# Altium footprint library ref-packages.PCBLIB: 1544 footprints (part 41 of 103) (continued)
## PLCC52 [mil] (continued)
  lines w6: -376.38,-319.33 -376.38,-356.69 -356.69,-376.38 -319.33,-376.38 ; -376.38,-280.67 -376.38,-269.33 ; -376.38,-230.67 -376.38,-219.33 ; -376.38,-180.67 -376.38,-169.33 ; -376.38,-130.67 -376.38,-119.33 ; -376.38,-80.67 -376.38,-69.33 ; -376.38,-30.67 -376.38,-19.33 ; -376.38,19.33 -376.38,30.67 ; -376.38,69.33 -376.38,80.67 ; -376.38,119.33 -376.38,130.67 ; -376.38,169.33 -376.38,180.67 ; -376.38,219.33 -376.38,230.67 ; -376.38,269.33 -376.38,280.67 ; -376.38,319.33 -376.38,327.17 -319.33,372.4 ; -280.67,-376.38 -269.33,-376.38 ; -280.67,376.38 -269.33,376.38 ; -230.67,-376.38 -219.33,-376.38 ; -230.67,376.38 -219.33,376.38 ; -180.67,-376.38 -169.33,-376.38 ; -180.67,376.38 -169.33,376.38 ; -130.67,-376.38 -119.33,-376.38 ; -130.67,376.38 -119.33,376.38 ; -80.67,-376.38 -69.33,-376.38 ; -80.67,376.38 -69.33,376.38 ; -30.67,-376.38 -19.33,-376.38 ; -30.67,376.38 -19.33,376.38 ; 19.33,-376.38 30.67,-376.38 ; 19.33,376.38 30.67,376.38 ; 69.33,-376.38 80.67,-376.38 ; 69.33,376.38 80.67,376.38 ; 119.33,-376.38 130.67,-376.38 ; 119.33,376.38 130.67,376.38 ; 169.33,-376.38 180.67,-376.38 ; 169.33,376.38 180.67,376.38 ; 219.33,-376.38 230.67,-376.38 ; 219.33,376.38 230.67,376.38 ; 269.33,-376.38 280.67,-376.38 ; 269.33,376.38 280.67,376.38 ; 319.33,-376.38 356.69,-376.38 376.38,-356.69 ; 319.33,376.38 356.69,376.38 376.38,356.69 ; 356.69,-346.85 376.38,-356.69 ; 356.69,327.17 376.38,356.69 ; 376.38,-319.33 376.38,-356.69 ; 376.38,-280.67 376.38,-269.33 ; 376.38,-230.67 376.38,-219.33 ; 376.38,-180.67 376.38,-169.33 ; 376.38,-130.67 376.38,-119.33 ; 376.38,-80.67 376.38,-69.33 ; 376.38,-30.67 376.38,-19.33 ; 376.38,19.33 376.38,30.67 ; 376.38,69.33 376.38,80.67 ; 376.38,119.33 376.38,130.67 ; 376.38,169.33 376.38,180.67 ; 376.38,219.33 376.38,230.67 ; 376.38,269.33 376.38,280.67 ; 376.38,319.33 376.38,356.69
Mechanical 16:
  circle w2: c0,284.65 r19.69
  rectangle: 376.38,85.04 394.88,114.96
  rectangle: 376.38,35.04 394.88,64.96
  rectangle: 376.38,-14.96 394.88,14.96
  rectangle: 376.38,-64.96 394.88,-35.04
  rectangle: 376.38,-114.96 394.88,-85.04
  rectangle: 376.38,-164.96 394.88,-135.04
  rectangle: 376.38,-214.96 394.88,-185.04
  rectangle: 135.04,-394.88 164.96,-376.38
  rectangle: 85.04,-394.88 114.96,-376.38
  rectangle: 35.04,-394.88 64.96,-376.38
  rectangle: -14.96,-394.88 14.96,-376.38
  rectangle: -64.96,-394.88 -35.04,-376.38
  rectangle: -114.96,-394.88 -85.04,-376.38
  rectangle: -314.96,-394.88 -285.04,-376.38
  rectangle: -394.88,185.04 -376.38,214.96
  rectangle: -394.88,135.04 -376.38,164.96
  rectangle: -394.88,85.04 -376.38,114.96
  rectangle: -394.88,35.04 -376.38,64.96
  rectangle: -394.88,-14.96 -376.38,14.96
  rectangle: -394.88,-64.96 -376.38,-35.04
  rectangle: -394.88,-114.96 -376.38,-85.04
  rectangle: 135.04,376.38 164.96,394.88
  rectangle: 85.04,376.38 114.96,394.88
  rectangle: 35.04,376.38 64.96,394.88
  rectangle: -14.96,376.38 14.96,394.88
  rectangle: -64.96,376.38 -35.04,394.88
  rectangle: -114.96,376.38 -85.04,394.88
  rectangle: -314.96,376.38 -285.04,394.88
  rectangle: 376.38,135.04 394.88,164.96
  rectangle: 376.38,185.04 394.88,214.96
  rectangle: -394.88,-164.96 -376.38,-135.04
  rectangle: -394.88,-214.96 -376.38,-185.04
  rectangle: 185.04,376.38 214.96,394.88
  rectangle: 285.04,376.38 314.96,394.88
  rectangle: -164.96,376.38 -135.04,394.88
  rectangle: -214.96,376.38 -185.04,394.88
  rectangle: -394.88,-314.96 -376.38,-285.04
  rectangle: -214.96,-394.88 -185.04,-376.38
  rectangle: -164.96,-394.88 -135.04,-376.38
  rectangle: 185.04,-394.88 214.96,-376.38
  rectangle: 285.04,-394.88 314.96,-376.38
  rectangle: 376.38,-314.96 394.88,-285.04
  rectangle: 376.38,285.04 394.88,314.96
  rectangle: -394.88,285.04 -376.38,314.96
  rectangle: -264.96,376.38 -235.04,394.88
  rectangle: -394.88,235.04 -376.38,264.96
  rectangle: -394.88,-264.96 -376.38,-235.04
  rectangle: -264.96,-394.88 -235.04,-376.38
  rectangle: 235.04,-394.88 264.96,-376.38
  rectangle: 376.38,-264.96 394.88,-235.04
  rectangle: 376.38,235.04 394.88,264.96
  rectangle: 235.04,376.38 264.96,394.88
  lines w2: -376.38,-356.69 -356.69,-346.85 ; -376.38,327.17 -356.69,327.17 ; -356.69,-376.38 -346.85,-356.69 ; -314.96,376.38 -356.69,327.17 ; 356.69,-376.38 346.85,-356.69 ; 376.38,-356.69 356.69,-346.85 ; 376.38,356.69 356.69,327.17 ; -356.69,-346.85 -346.85,-356.69 ; -356.69,-346.85 -356.69,327.17 ; -356.69,327.17 356.69,327.17 ; -346.85,-356.69 346.85,-356.69 ; 346.85,-356.69 356.69,-346.85 ; 356.69,-346.85 356.69,327.17
  lines w6: -376.38,-356.69 -356.69,-376.38 356.69,-376.38 376.38,-356.69 376.38,356.69 356.69,376.38 -314.96,376.38 -376.38,327.17 -376.38,-356.69

## PLCC52-S [mil]
pads (52):
  round 48 hole 32: 1(0,400)
  oct 48x48 hole 32: 2(0,300) 3(-100,400) 4(-100,300) 5(-200,400) 6(-200,300) 7(-300,400) 8(-400,300) 9(-300,300) 10(-400,200) 11(-300,200) 12(-400,100) 13(-300,100) 14(-400,0) 15(-300,0) 16(-400,-100) 17(-300,-100) 18(-400,-200) 19(-300,-200) 20(-400,-300) 21(-300,-400) 22(-300,-300) 23(-200,-400) 24(-200,-300) 25(-100,-400) 26(-100,-300) 27(0,-400) 28(0,-300) 29(100,-400) 30(100,-300) 31(200,-400) 32(200,-300) 33(300,-400) 34(400,-300) 35(300,-300) 36(400,-200) 37(300,-200) 38(400,-100) 39(300,-100) 40(400,0) 41(300,0) 42(400,100) 43(300,100) 44(300,200) 45(400,200) 46(400,300) 47(300,400) 48(300,300) 49(200,400) 50(200,300) 51(100,400) 52(100,300)
Top Overlay:
  drawing of 199 lines, arcs and shapes, not listed
  text "52" at 375,-475 h77.5
Mechanical 16:
  drawing of 160 lines, arcs and shapes, not listed

## PLCC52S [mil]
pads (52):
  rect 23.62x86.61 smd: 1(0,370.08) 2(-50,370.08) 3(-100,370.08) 4(-150,370.08) 5(-200,370.08) 6(-250,370.08) 7(-300,370.08) 21(-300,-370.08) 22(-250,-370.08) 23(-200,-370.08) 24(-150,-370.08) 25(-100,-370.08) 26(-50,-370.08) 27(0,-370.08) 28(50,-370.08) 29(100,-370.08) 30(150,-370.08) 31(200,-370.08) 32(250,-370.08) 33(300,-370.08) 47(300,370.08) 48(250,370.08) 49(200,370.08) 50(150,370.08) 51(100,370.08) 52(50,370.08)
  rect 86.61x23.62 smd: 8(-370.08,300) 9(-370.08,250) 10(-370.08,200) 11(-370.08,150) 12(-370.08,100) 13(-370.08,50) 14(-370.08,0) 15(-370.08,-50) 16(-370.08,-100) 17(-370.08,-150) 18(-370.08,-200) 19(-370.08,-250) 20(-370.08,-300) 34(370.08,-300) 35(370.08,-250) 36(370.08,-200) 37(370.08,-150) 38(370.08,-100) 39(370.08,-50) 40(370.08,0) 41(370.08,50) 42(370.08,100) 43(370.08,150) 44(370.08,200) 45(370.08,250) 46(370.08,300)
Mechanical 16:
  circle w24: c0,350.39 r11.81
  rectangle: -10.24,395.67 10.24,413.39
  rectangle: -60.24,395.67 -39.76,413.39
  rectangle: -110.24,395.67 -89.76,413.39
  rectangle: -160.24,395.67 -139.76,413.39
  rectangle: -210.24,395.67 -189.76,413.39
  rectangle: -260.24,395.67 -239.76,413.39
  rectangle: -310.24,395.67 -289.76,413.39
  rectangle: -413.39,289.76 -395.67,310.24
  rectangle: -413.39,239.76 -395.67,260.24
  rectangle: -413.39,189.76 -395.67,210.24
  rectangle: -413.39,139.76 -395.67,160.24
  rectangle: -413.39,89.76 -395.67,110.24
  rectangle: -413.39,39.76 -395.67,60.24
  rectangle: -413.39,-10.24 -395.67,10.24
  rectangle: -413.39,-60.24 -395.67,-39.76
  rectangle: -413.39,-110.24 -395.67,-89.76
  rectangle: -413.39,-160.24 -395.67,-139.76
  rectangle: -413.39,-210.24 -395.67,-189.76
  rectangle: -413.39,-260.24 -395.67,-239.76
  rectangle: -413.39,-310.24 -395.67,-289.76
  rectangle: -310.24,-413.39 -289.76,-395.67
  rectangle: -260.24,-413.39 -239.76,-395.67
  rectangle: -210.24,-413.39 -189.76,-395.67
  rectangle: -160.24,-413.39 -139.76,-395.67
  rectangle: -110.24,-413.39 -89.76,-395.67
  rectangle: -60.24,-413.39 -39.76,-395.67
  rectangle: -10.24,-413.39 10.24,-395.67
  rectangle: 39.76,-413.39 60.24,-395.67
  rectangle: 89.76,-413.39 110.24,-395.67
  rectangle: 139.76,-413.39 160.24,-395.67
  rectangle: 189.76,-413.39 210.24,-395.67
  rectangle: 239.76,-413.39 260.24,-395.67
  rectangle: 289.76,-413.39 310.24,-395.67
  rectangle: 395.67,-310.24 413.39,-289.76
  rectangle: 395.67,-260.24 413.39,-239.76
  rectangle: 395.67,-210.24 413.39,-189.76
  rectangle: 395.67,-160.24 413.39,-139.76
  rectangle: 395.67,-110.24 413.39,-89.76
  rectangle: 395.67,-60.24 413.39,-39.76
  rectangle: 395.67,-10.24 413.39,10.24
  rectangle: 395.67,39.76 413.39,60.24
  rectangle: 395.67,89.76 413.39,110.24
  rectangle: 395.67,139.76 413.39,160.24
  rectangle: 395.67,189.76 413.39,210.24
  rectangle: 395.67,239.76 413.39,260.24
  rectangle: 395.67,289.76 413.39,310.24
  rectangle: 289.76,395.67 310.24,413.39
  rectangle: 239.76,395.67 260.24,413.39
  rectangle: 189.76,395.67 210.24,413.39
  rectangle: 139.76,395.67 160.24,413.39
  rectangle: 89.76,395.67 110.24,413.39
  rectangle: 39.76,395.67 60.24,413.39
  lines w8: -393.7,-393.7 -393.7,305.71 -305.71,393.7 393.7,393.7 393.7,-393.7 -393.7,-393.7
Mechanical 27:
  lines w7.87: -429.25,-429.25 429.25,-429.25 429.25,429.25 -429.25,429.25 -429.25,-429.25

## PLCC68 [mil]
pads (68):
  rect 29.92x70.87 smd: 1(0,459.45) 2(-50,459.45) 3(-100,459.45) 4(-150,459.45) 5(-200,459.45) 6(-250,459.45) 7(-300,459.45) 8(-350,459.45) 9(-400,459.45) 27(-400,-459.45) 28(-350,-459.45) 29(-300,-459.45) 30(-250,-459.45) 31(-200,-459.45) 32(-150,-459.45) 33(-100,-459.45) 34(-50,-459.45) 35(0,-459.45) 36(50,-459.45) 37(100,-459.45) 38(150,-459.45) 39(200,-459.45) 40(250,-459.45) 41(300,-459.45) 42(350,-459.45) 43(400,-459.45) 61(400,459.45) 62(350,459.45) 63(300,459.45) 64(250,459.45) 65(200,459.45) 66(150,459.45) 67(100,459.45) 68(50,459.45)
  rect 70.87x29.92 smd: 10(-459.45,400) 11(-459.45,350) 12(-459.45,300) 13(-459.45,250) 14(-459.45,200) 15(-459.45,150) 16(-459.45,100) 17(-459.45,50) 18(-459.45,0) 19(-459.45,-50) 20(-459.45,-100) 21(-459.45,-150) 22(-459.45,-200) 23(-459.45,-250) 24(-459.45,-300) 25(-459.45,-350) 26(-459.45,-400) 44(459.45,-400) 45(459.45,-350) 46(459.45,-300) 47(459.45,-250) 48(459.45,-200) 49(459.45,-150) 50(459.45,-100) 51(459.45,-50) 52(459.45,0) 53(459.45,50) 54(459.45,100) 55(459.45,150) 56(459.45,200) 57(459.45,250) 58(459.45,300) 59(459.45,350) 60(459.45,400)
Top Overlay:
  drawing of 157 lines, arcs and shapes, not listed
Mechanical 16:
  circle w2: c0,384.65 r19.69
  rectangle: 476.38,85.04 494.88,114.96
  rectangle: 476.38,35.04 494.88,64.96
  rectangle: 476.38,-14.96 494.88,14.96
  rectangle: 476.38,-64.96 494.88,-35.04
  rectangle: 476.38,-114.96 494.88,-85.04
  rectangle: 476.38,-164.96 494.88,-135.04
  rectangle: 476.38,-214.96 494.88,-185.04
  rectangle: 135.04,-494.88 164.96,-476.38
  rectangle: 85.04,-494.88 114.96,-476.38
  rectangle: 35.04,-494.88 64.96,-476.38
  rectangle: -14.96,-494.88 14.96,-476.38
  rectangle: -64.96,-494.88 -35.04,-476.38
  rectangle: -114.96,-494.88 -85.04,-476.38
  rectangle: -414.96,-494.88 -385.04,-476.38
  rectangle: -494.88,185.04 -476.38,214.96
  rectangle: -494.88,135.04 -476.38,164.96
  rectangle: -494.88,85.04 -476.38,114.96
  rectangle: -494.88,35.04 -476.38,64.96
  rectangle: -494.88,-14.96 -476.38,14.96
  rectangle: -494.88,-64.96 -476.38,-35.04
  rectangle: -494.88,-114.96 -476.38,-85.04
  rectangle: 135.04,476.38 164.96,494.88
  rectangle: 85.04,476.38 114.96,494.88
  rectangle: 35.04,476.38 64.96,494.88
  rectangle: -14.96,476.38 14.96,494.88
  rectangle: -64.96,476.38 -35.04,494.88
  rectangle: -114.96,476.38 -85.04,494.88
  rectangle: -414.96,476.38 -385.04,494.88
  rectangle: 476.38,135.04 494.88,164.96
  rectangle: 476.38,185.04 494.88,214.96
  rectangle: -494.88,-164.96 -476.38,-135.04
  rectangle: -494.88,-214.96 -476.38,-185.04
  rectangle: 185.04,476.38 214.96,494.88
  rectangle: 235.04,476.38 264.96,494.88
  rectangle: -164.96,476.38 -135.04,494.88
  rectangle: -214.96,476.38 -185.04,494.88
  rectangle: -494.88,-264.96 -476.38,-235.04
  rectangle: -214.96,-494.88 -185.04,-476.38
  rectangle: -164.96,-494.88 -135.04,-476.38
  rectangle: 185.04,-494.88 214.96,-476.38
  rectangle: 235.04,-494.88 264.96,-476.38
  rectangle: 476.38,-264.96 494.88,-235.04
  rectangle: 476.38,235.04 494.88,264.96
  rectangle: -494.88,235.04 -476.38,264.96
  rectangle: -264.96,-494.88 -235.04,-476.38
  rectangle: -314.96,-494.88 -285.04,-476.38
  rectangle: -364.96,-494.88 -335.04,-476.38
  rectangle: -494.88,-314.96 -476.38,-285.04
  rectangle: -494.88,-364.96 -476.38,-335.04
  rectangle: -494.88,-414.96 -476.38,-385.04
  rectangle: -494.88,285.04 -476.38,314.96
  rectangle: -494.88,335.04 -476.38,364.96
  rectangle: -494.88,385.04 -476.38,414.96
  rectangle: -264.96,476.38 -235.04,494.88
  rectangle: -314.96,476.38 -285.04,494.88
  rectangle: -364.96,476.38 -335.04,494.88
  rectangle: 476.38,285.04 494.88,314.96
  rectangle: 476.38,335.04 494.88,364.96
  rectangle: 476.38,385.04 494.88,414.96
  rectangle: 285.04,476.38 314.96,494.88
  rectangle: 335.04,476.38 364.96,494.88
  rectangle: 385.04,476.38 414.96,494.88
  rectangle: 476.38,-314.96 494.88,-285.04
  rectangle: 476.38,-364.96 494.88,-335.04
  rectangle: 476.38,-414.96 494.88,-385.04
  rectangle: 285.04,-494.88 314.96,-476.38
  rectangle: 335.04,-494.88 364.96,-476.38
  rectangle: 385.04,-494.88 414.96,-476.38
  lines w2: -476.38,-456.69 -456.69,-446.85 ; -476.38,427.17 -456.69,427.17 ; -456.69,-476.38 -446.85,-456.69 ; -414.96,476.38 -456.69,427.17 ; 456.69,-476.38 446.85,-456.69 ; 476.38,-456.69 456.69,-446.85 ; 476.38,456.69 456.69,427.17 ; -456.69,-446.85 -446.85,-456.69 ; -456.69,-446.85 -456.69,427.17 ; -456.69,427.17 456.69,427.17 ; -446.85,-456.69 446.85,-456.69 ; 446.85,-456.69 456.69,-446.85 ; 456.69,-446.85 456.69,427.17
  lines w6: -476.38,-456.69 -456.69,-476.38 456.69,-476.38 476.38,-456.69 476.38,456.69 456.69,476.38 -414.96,476.38 -476.38,427.17 -476.38,-456.69

## PLCC68-S [mil]
pads (68):
  round 48 hole 32: 1(0,500)
  oct 48x48 hole 32: 2(0,400) 3(-100,500) 4(-100,400) 5(-200,500) 6(-200,400) 7(-300,500) 8(-300,400) 9(-400,500) 10(-500,400) 11(-400,400) 12(-500,300) 13(-400,300) 14(-500,200) 15(-400,200) 16(-500,100) 17(-400,100) 18(-500,0) 19(-400,0) 20(-500,-100) 21(-400,-100) 22(-500,-200) 23(-400,-200) 24(-500,-300) 25(-400,-300) 26(-500,-400) 27(-400,-500) 28(-400,-400) 29(-300,-500) 30(-300,-400) 31(-200,-500) 32(-200,-400) 33(-100,-500) 34(-100,-400) 35(0,-500) 36(0,-400) 37(100,-500) 38(100,-400) 39(200,-500) 40(200,-400) 41(300,-500) 42(300,-400) 43(400,-500) 44(500,-400) 45(400,-400) 46(500,-300) 47(400,-300) 48(500,-200) 49(400,-200) 50(500,-100) 51(400,-100) 52(500,0) 53(400,0) 54(500,100) 55(400,100) 56(500,200) 57(400,200) 58(500,300) 59(400,300) 60(500,400) 61(400,500) 62(400,400) 63(300,500) 64(300,400) 65(200,500) 66(200,400) 67(100,500) 68(100,400)
Top Overlay:
  drawing of 259 lines, arcs and shapes, not listed
  text "68" at 475,-575 h77.5
Mechanical 16:
  drawing of 207 lines, arcs and shapes, not listed

## PLCC68S [mil]
pads (68):
  rect 23.62x86.61 smd: 1(0,468.5) 2(-50,468.5) 3(-100,468.5) 4(-150,468.5) 5(-200,468.5) 6(-250,468.5) 7(-300,468.5) 8(-350,468.5) 9(-400,468.5) 27(-400,-468.5) 28(-350,-468.5) 29(-300,-468.5) 30(-250,-468.5) 31(-200,-468.5) 32(-150,-468.5) 33(-100,-468.5) 34(-50,-468.5) 35(0,-468.5) 36(50,-468.5) 37(100,-468.5) 38(150,-468.5) 39(200,-468.5) 40(250,-468.5) 41(300,-468.5) 42(350,-468.5) 43(400,-468.5) 61(400,468.5) 62(350,468.5) 63(300,468.5) 64(250,468.5) 65(200,468.5) 66(150,468.5) 67(100,468.5) 68(50,468.5)
  rect 86.61x23.62 smd: 10(-468.5,400) 11(-468.5,350) 12(-468.5,300) 13(-468.5,250) 14(-468.5,200) 15(-468.5,150) 16(-468.5,100) 17(-468.5,50) 18(-468.5,0) 19(-468.5,-50) 20(-468.5,-100) 21(-468.5,-150) 22(-468.5,-200) 23(-468.5,-250) 24(-468.5,-300) 25(-468.5,-350) 26(-468.5,-400) 44(468.5,-400) 45(468.5,-350) 46(468.5,-300) 47(468.5,-250) 48(468.5,-200) 49(468.5,-150) 50(468.5,-100) 51(468.5,-50) 52(468.5,0) 53(468.5,50) 54(468.5,100) 55(468.5,150) 56(468.5,200) 57(468.5,250) 58(468.5,300) 59(468.5,350) 60(468.5,400)
Mechanical 16:
  circle w24: c0,448.82 r11.81
  rectangle: -10.24,494.09 10.24,511.81
  rectangle: -60.24,494.09 -39.76,511.81
  rectangle: -110.24,494.09 -89.76,511.81
  rectangle: -160.24,494.09 -139.76,511.81
  rectangle: -210.24,494.09 -189.76,511.81
  rectangle: -260.24,494.09 -239.76,511.81
  rectangle: -310.24,494.09 -289.76,511.81
  rectangle: -360.24,494.09 -339.76,511.81
  rectangle: -410.24,494.09 -389.76,511.81
  rectangle: -511.81,389.76 -494.09,410.24
  rectangle: -511.81,339.76 -494.09,360.24
  rectangle: -511.81,289.76 -494.09,310.24
  rectangle: -511.81,239.76 -494.09,260.24
  rectangle: -511.81,189.76 -494.09,210.24
  rectangle: -511.81,139.76 -494.09,160.24
  rectangle: -511.81,89.76 -494.09,110.24
  rectangle: -511.81,39.76 -494.09,60.24
  rectangle: -511.81,-10.24 -494.09,10.24
  rectangle: -511.81,-60.24 -494.09,-39.76
  rectangle: -511.81,-110.24 -494.09,-89.76
  rectangle: -511.81,-160.24 -494.09,-139.76
  rectangle: -511.81,-210.24 -494.09,-189.76
  rectangle: -511.81,-260.24 -494.09,-239.76
  rectangle: -511.81,-310.24 -494.09,-289.76
  rectangle: -511.81,-360.24 -494.09,-339.76
  rectangle: -511.81,-410.24 -494.09,-389.76
  rectangle: -410.24,-511.81 -389.76,-494.09
  rectangle: -360.24,-511.81 -339.76,-494.09
  rectangle: -310.24,-511.81 -289.76,-494.09
  rectangle: -260.24,-511.81 -239.76,-494.09
  rectangle: -210.24,-511.81 -189.76,-494.09
  rectangle: -160.24,-511.81 -139.76,-494.09
  rectangle: -110.24,-511.81 -89.76,-494.09
  rectangle: -60.24,-511.81 -39.76,-494.09
  rectangle: -10.24,-511.81 10.24,-494.09
  rectangle: 39.76,-511.81 60.24,-494.09
  rectangle: 89.76,-511.81 110.24,-494.09
  rectangle: 139.76,-511.81 160.24,-494.09
  rectangle: 189.76,-511.81 210.24,-494.09
  rectangle: 239.76,-511.81 260.24,-494.09
  rectangle: 289.76,-511.81 310.24,-494.09
  rectangle: 339.76,-511.81 360.24,-494.09
  rectangle: 389.76,-511.81 410.24,-494.09
  rectangle: 494.09,-410.24 511.81,-389.76
  rectangle: 494.09,-360.24 511.81,-339.76
  rectangle: 494.09,-310.24 511.81,-289.76
  rectangle: 494.09,-260.24 511.81,-239.76
  rectangle: 494.09,-210.24 511.81,-189.76
  rectangle: 494.09,-160.24 511.81,-139.76
  rectangle: 494.09,-110.24 511.81,-89.76
  rectangle: 494.09,-60.24 511.81,-39.76
  rectangle: 494.09,-10.24 511.81,10.24
  rectangle: 494.09,39.76 511.81,60.24
  rectangle: 494.09,89.76 511.81,110.24
  rectangle: 494.09,139.76 511.81,160.24
  rectangle: 494.09,189.76 511.81,210.24
  rectangle: 494.09,239.76 511.81,260.24
  rectangle: 494.09,289.76 511.81,310.24
  rectangle: 494.09,339.76 511.81,360.24
  rectangle: 494.09,389.76 511.81,410.24
  rectangle: 389.76,494.09 410.24,511.81
  rectangle: 339.76,494.09 360.24,511.81
  rectangle: 289.76,494.09 310.24,511.81
  rectangle: 239.76,494.09 260.24,511.81
  rectangle: 189.76,494.09 210.24,511.81
  rectangle: 139.76,494.09 160.24,511.81
  rectangle: 89.76,494.09 110.24,511.81
  rectangle: 39.76,494.09 60.24,511.81
  lines w8: -492.13,-492.13 -492.13,404.13 -404.13,492.13 492.13,492.13 492.13,-492.13 -492.13,-492.13
Mechanical 27:
  lines w7.87: -527.68,-527.68 527.68,-527.68 527.68,527.68 -527.68,527.68 -527.68,-527.68

## PLCC68SOCK [mil]
pads (68):
  round 48 hole 32: 1(0,500)
  oct 48x48 hole 32: 2(0,400) 3(-100,500) 4(-100,400) 5(-200,500) 6(-200,400) 7(-300,500) 8(-300,400) 9(-400,500) 10(-500,400) 11(-400,400) 12(-500,300) 13(-400,300) 14(-500,200) 15(-400,200) 16(-500,100) 17(-400,100) 18(-500,0) 19(-400,0) 20(-500,-100) 21(-400,-100) 22(-500,-200) 23(-400,-200) 24(-500,-300) 25(-400,-300) 26(-500,-400) 27(-400,-500) 28(-400,-400) 29(-300,-500) 30(-300,-400) 31(-200,-500) 32(-200,-400) 33(-100,-500) 34(-100,-400) 35(0,-500) 36(0,-400) 37(100,-500) 38(100,-400) 39(200,-500) 40(200,-400) 41(300,-500) 42(300,-400) 43(400,-500) 44(500,-400) 45(400,-400) 46(500,-300) 47(400,-300) 48(500,-200) 49(400,-200) 50(500,-100) 51(400,-100) 52(500,0) 53(400,0) 54(500,100) 55(400,100) 56(500,200) 57(400,200) 58(500,300) 59(400,300) 60(500,400) 61(400,500) 62(400,400) 63(300,500) 64(300,400) 65(200,500) 66(200,400) 67(100,500) 68(100,400)
Top Overlay:
  drawing of 259 lines, arcs and shapes, not listed
  text "68" at 475,-575 h77.5
Mechanical 16:
  drawing of 207 lines, arcs and shapes, not listed

## PLCC84 [mil]
pads (84):
  rect 29.92x70.87 smd: 1(0,559.45) 2(-50,559.45) 3(-100,559.45) 4(-150,559.45) 5(-200,559.45) 6(-250,559.45) 7(-300,559.45) 8(-350,559.45) 9(-400,559.45) 10(-450,559.45) 11(-500,559.45) 33(-500,-559.45) 34(-450,-559.45) 35(-400,-559.45) 36(-350,-559.45) 37(-300,-559.45) 38(-250,-559.45) 39(-200,-559.45) 40(-150,-559.45) 41(-100,-559.45) 42(-50,-559.45) 43(0,-559.45) 44(50,-559.45) 45(100,-559.45) 46(150,-559.45) 47(200,-559.45) 48(250,-559.45) 49(300,-559.45) 50(350,-559.45) 51(400,-559.45) 52(450,-559.45) 53(500,-559.45) 75(500,559.45) 76(450,559.45) 77(400,559.45) 78(350,559.45) 79(300,559.45) 80(250,559.45) 81(200,559.45) 82(150,559.45) 83(100,559.45) 84(50,559.45)
  rect 70.87x29.92 smd: 12(-559.45,500) 13(-559.45,450) 14(-559.45,400) 15(-559.45,350) 16(-559.45,300) 17(-559.45,250) 18(-559.45,200) 19(-559.45,150) 20(-559.45,100) 21(-559.45,50) 22(-559.45,0) 23(-559.45,-50) 24(-559.45,-100) 25(-559.45,-150) 26(-559.45,-200) 27(-559.45,-250) 28(-559.45,-300) 29(-559.45,-350) 30(-559.45,-400) 31(-559.45,-450) 32(-559.45,-500) 54(559.45,-500) 55(559.45,-450) 56(559.45,-400) 57(559.45,-350) 58(559.45,-300) 59(559.45,-250) 60(559.45,-200) 61(559.45,-150) 62(559.45,-100) 63(559.45,-50) 64(559.45,0) 65(559.45,50) 66(559.45,100) 67(559.45,150) 68(559.45,200) 69(559.45,250) 70(559.45,300) 71(559.45,350) 72(559.45,400) 73(559.45,450) 74(559.45,500)
Top Overlay:
  drawing of 189 lines, arcs and shapes, not listed
Mechanical 16:
  rectangle: 576.38,85.04 594.88,114.96
  rectangle: 576.38,35.04 594.88,64.96
  rectangle: 576.38,-14.96 594.88,14.96
  rectangle: 576.38,-64.96 594.88,-35.04
  rectangle: 576.38,-114.96 594.88,-85.04
  rectangle: 576.38,-164.96 594.88,-135.04
  rectangle: 576.38,-214.96 594.88,-185.04
  rectangle: 135.04,-594.88 164.96,-576.38
  rectangle: 85.04,-594.88 114.96,-576.38
  rectangle: 35.04,-594.88 64.96,-576.38
  rectangle: -14.96,-594.88 14.96,-576.38
  rectangle: -64.96,-594.88 -35.04,-576.38
  rectangle: -114.96,-594.88 -85.04,-576.38
  rectangle: -514.96,-594.88 -485.04,-576.38
  rectangle: -594.88,185.04 -576.38,214.96
  rectangle: -594.88,135.04 -576.38,164.96
  rectangle: -594.88,85.04 -576.38,114.96
  rectangle: -594.88,35.04 -576.38,64.96
  rectangle: -594.88,-14.96 -576.38,14.96
  rectangle: -594.88,-64.96 -576.38,-35.04
  rectangle: -594.88,-114.96 -576.38,-85.04
  rectangle: 135.04,576.38 164.96,594.88
  rectangle: 85.04,576.38 114.96,594.88
  rectangle: 35.04,576.38 64.96,594.88
  rectangle: -14.96,576.38 14.96,594.88
  rectangle: -64.96,576.38 -35.04,594.88
  rectangle: -114.96,576.38 -85.04,594.88
  rectangle: -514.96,576.38 -485.04,594.88
  rectangle: 576.38,135.04 594.88,164.96
  rectangle: 576.38,185.04 594.88,214.96
  rectangle: -594.88,-164.96 -576.38,-135.04
  rectangle: -594.88,-214.96 -576.38,-185.04
  rectangle: 185.04,576.38 214.96,594.88
  rectangle: 235.04,576.38 264.96,594.88
  rectangle: -164.96,576.38 -135.04,594.88
  rectangle: -214.96,576.38 -185.04,594.88
  rectangle: -594.88,-264.96 -576.38,-235.04
  rectangle: -214.96,-594.88 -185.04,-576.38
  rectangle: -164.96,-594.88 -135.04,-576.38
  rectangle: 185.04,-594.88 214.96,-576.38
  rectangle: 235.04,-594.88 264.96,-576.38
  rectangle: 576.38,-264.96 594.88,-235.04
  rectangle: 576.38,235.04 594.88,264.96
  rectangle: -594.88,235.04 -576.38,264.96
  rectangle: -264.96,-594.88 -235.04,-576.38
  rectangle: -314.96,-594.88 -285.04,-576.38
  rectangle: -364.96,-594.88 -335.04,-576.38
  rectangle: -594.88,-314.96 -576.38,-285.04
  rectangle: -594.88,-364.96 -576.38,-335.04
  rectangle: -594.88,-414.96 -576.38,-385.04
  rectangle: -594.88,285.04 -576.38,314.96
  rectangle: -594.88,335.04 -576.38,364.96
  rectangle: -594.88,385.04 -576.38,414.96
  rectangle: -264.96,576.38 -235.04,594.88
  rectangle: -314.96,576.38 -285.04,594.88
  rectangle: -364.96,576.38 -335.04,594.88
  rectangle: 576.38,285.04 594.88,314.96
  rectangle: 576.38,335.04 594.88,364.96
  rectangle: 576.38,385.04 594.88,414.96
  rectangle: 285.04,576.38 314.96,594.88
  rectangle: 335.04,576.38 364.96,594.88
  rectangle: 385.04,576.38 414.96,594.88
  rectangle: 576.38,-314.96 594.88,-285.04
  rectangle: 576.38,-364.96 594.88,-335.04
  rectangle: 576.38,-414.96 594.88,-385.04
  rectangle: 285.04,-594.88 314.96,-576.38
  rectangle: 335.04,-594.88 364.96,-576.38
  rectangle: 385.04,-594.88 414.96,-576.38
  rectangle: -464.96,-594.88 -435.04,-576.38
  rectangle: -414.96,-594.88 -385.04,-576.38
  rectangle: -594.88,-464.96 -576.38,-435.04
  rectangle: -594.88,-514.96 -576.38,-485.04
  rectangle: -594.88,435.04 -576.38,464.96
  rectangle: -594.88,485.04 -576.38,514.96
  rectangle: -464.96,576.38 -435.04,594.88
  rectangle: -414.96,576.38 -385.04,594.88
  rectangle: 435.04,576.38 464.96,594.88
  rectangle: 485.04,576.38 514.96,594.88
  rectangle: 576.38,435.04 594.88,464.96
  rectangle: 576.38,485.04 594.88,514.96
  rectangle: 435.04,-594.88 464.96,-576.38
  rectangle: 576.38,-464.96 594.88,-435.04
  rectangle: 576.38,-514.96 594.88,-485.04
  rectangle: 485.04,-594.88 514.96,-576.38
  lines w2: -576.38,-556.69 -556.69,-546.85 ; -576.38,527.17 -556.69,527.17 ; -556.69,-576.38 -546.85,-556.69 ; -514.96,576.38 -556.69,527.17 ; 556.69,-576.38 546.85,-556.69 ; 576.38,-556.69 556.69,-546.85 ; 576.38,556.69 556.69,527.17 ; -556.69,-546.85 -546.85,-556.69 ; -556.69,-546.85 -556.69,527.17 ; -556.69,527.17 556.69,527.17 ; -546.85,-556.69 546.85,-556.69 ; 546.85,-556.69 556.69,-546.85 ; 556.69,-546.85 556.69,527.17
  lines w6: -576.38,-556.69 -556.69,-576.38 556.69,-576.38 576.38,-556.69 576.38,556.69 556.69,576.38 -514.96,576.38 -576.38,527.17 -576.38,-556.69